# Altium footprint library shkb_lib.PcbLib: 50 footprints (part 1 of 4)
Each footprint in its own frame and in the unit in brackets; x right, y up, seen from the top. Pads: shape width x height; smd on the part's side, far side on the other; paste and mask are expansions set on the pad; w line width, h text height; cw(c..) or ccw(c..) is an arc to the next point about the centre after c.
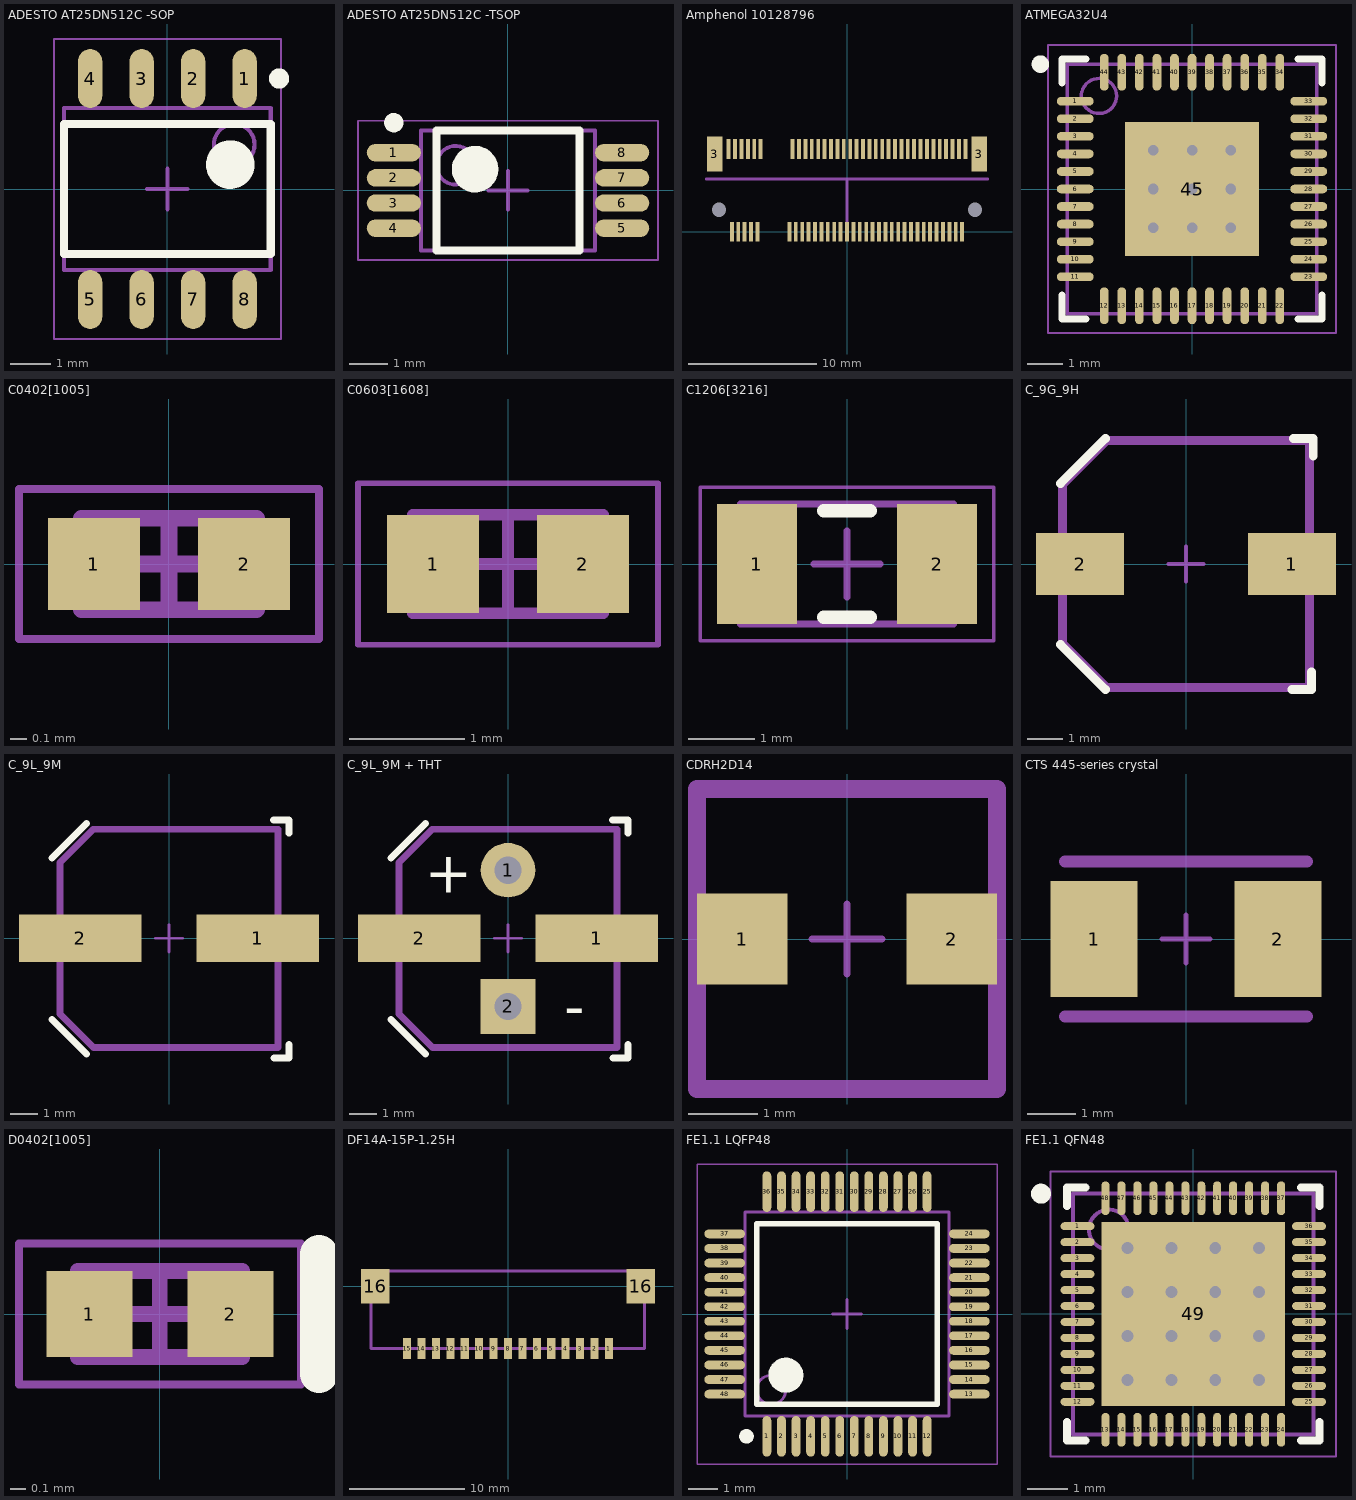
[diagram p0: the footprints below, top view; thin cyan lines are the x and y axes]

## ADESTO AT25DN512C -SOP [mm] "SOIC, 8-Leads, Body 4,92x3,90mm, Pitch 1,27mm, IPC Medium Density"
height 1.75
pads (8):
  oval 0.6x1.45 smd: 1(1.905,2.725) 2(0.635,2.725) 3(-0.635,2.725) 4(-1.905,2.725) 5(-1.905,-2.725) 6(-0.635,-2.725) 7(0.635,-2.725) 8(1.905,-2.725)
Top Overlay:
  circle w0.25: c2.755,2.725 r0.125
  circle w0.6: c1.55,0.6 r0.3
  lines w0.2: -2.55,-1.6 2.55,-1.6 2.55,1.6 -2.55,1.6 -2.55,-1.6
Mechanical 13:
  circle w0.1: c1.65,1.1 r0.5
  lines w0.1: -2.55,-2 2.55,-2 2.55,2 -2.55,2 -2.55,-2
  text ".Designator" at 2.21,-0.316 h0.5
Mechanical 15:
  lines w0.05: -2.8,-3.7 2.8,-3.7 2.8,3.7 -2.8,3.7 -2.8,-3.7
  lines w0.1: -0.5,0 0.5,0 ; 0,-0.5 0,0.5
3D body "ADESTO AT25DN512C.step": height 1.75, standoff 0, extent -2.55,-2.997 2.55,2.997

## ADESTO AT25DN512C -TSOP [mm] "TSOP, 8-Leads, Body 3,00x4,40mm, Pitch 0,65mm, IPC Medium Density"
height 1.2
pads (8):
  oval 1.4x0.45 smd: 1(-2.95,0.975) 2(-2.95,0.325) 3(-2.95,-0.325) 4(-2.95,-0.975) 5(2.95,-0.975) 6(2.95,-0.325) 7(2.95,0.325) 8(2.95,0.975)
Top Overlay:
  circle w0.25: c-2.95,1.75 r0.125
  circle w0.6: c-0.85,0.55 r0.3
  lines w0.2: -1.85,-1.55 -1.85,1.55 1.85,1.55 1.85,-1.55 -1.85,-1.55
Mechanical 13:
  circle w0.1: c-1.35,0.65 r0.5
  lines w0.1: -2.25,-1.55 -2.25,1.55 2.25,1.55 2.25,-1.55 -2.25,-1.55
  text ".Designator" at -1.778,-0.777 h0.5
Mechanical 15:
  lines w0.05: -3.875,-1.8 -3.875,1.8 3.875,1.8 3.875,-1.8 -3.875,-1.8
  lines w0.1: -0.5,0 0.5,0 ; 0,-0.5 0,0.5
3D body "ADESTO AT25DN512C -TSOP.step": height 1.2, standoff 0, extent -3.2,-1.55 3.2,1.55

## Amphenol 10128796 [mm]
pads (71):
  rect 0.3x1.55 smd: 1(-9.25,6.45) 2(-9,0) 3(-8.75,6.45) 4(-8.5,0) 5(-8.25,6.45) 6(-8,0) 7(-7.75,6.45) 8(-7.5,0) 9(-7.25,6.45) 10(-7,0) 11(-6.75,6.45) 20(-4.5,0) 21(-4.25,6.45) 22(-4,0) 23(-3.75,6.45) 24(-3.5,0) 25(-3.25,6.45) 26(-3,0) 27(-2.75,6.45) 28(-2.5,0) 29(-2.25,6.45) 30(-2,0) 31(-1.75,6.45) 32(-1.5,0) 33(-1.25,6.45) 34(-1,0) 35(-0.75,6.45) 36(-0.5,0) 37(-0.25,6.45) 38(0,0) 39(0.25,6.45) 40(0.5,0) 41(0.75,6.45) 42(1,0) 43(1.25,6.45) 44(1.5,0) 45(1.75,6.45) 46(2,0) 47(2.25,6.45) 48(2.5,0) 49(2.75,6.45) 50(3,0) 51(3.25,6.45) 52(3.5,0) 53(3.75,6.45) 54(4,0) 55(4.25,6.45) 56(4.5,0) 57(4.75,6.45) 58(5,0) 59(5.25,6.45) 60(5.5,0) 61(5.75,6.45) 62(6,0) 63(6.25,6.45) 64(6.5,0) 65(6.75,6.45) 66(7,0) 67(7.25,6.45) 68(7.5,0) 69(7.75,6.45) 70(8,0) 71(8.25,6.45) 72(8.5,0) 73(8.75,6.45) 74(9,0) 75(9.25,6.45)
  rect 1.2x2.75 smd: 3(-10.35,6.07) 3(10.35,6.07)
  round 0 hole 1.1 unplated: ""(-10,1.715) ""(10,1.715)
Mechanical 13:
  lines w0.2: -11,4.115 11,4.115 ; 0,-0.025 0,4.115
  text ".Designator" at -7.214,2.373 h0.5
3D body "10128796.stp": height 0.1, standoff -9, extent -10.928,-0.326 10.922,6.324

## ATMEGA32U4 [mm]
height 1
pads (45):
  oval 1.05x0.25 smd: 1(-3.325,2.5) 2(-3.325,2) 3(-3.325,1.5) 4(-3.325,1) 5(-3.325,0.5) 6(-3.325,0) 7(-3.325,-0.5) 8(-3.325,-1) 9(-3.325,-1.5) 10(-3.325,-2) 11(-3.325,-2.5) 23(3.325,-2.5) 24(3.325,-2) 25(3.325,-1.5) 26(3.325,-1) 27(3.325,-0.5) 28(3.325,0) 29(3.325,0.5) 30(3.325,1) 31(3.325,1.5) 32(3.325,2) 33(3.325,2.5)
  oval 0.25x1.05 smd: 12(-2.5,-3.325) 13(-2,-3.325) 14(-1.5,-3.325) 15(-1,-3.325) 16(-0.5,-3.325) 17(0,-3.325) 18(0.5,-3.325) 19(1,-3.325) 20(1.5,-3.325) 21(2,-3.325) 22(2.5,-3.325) 34(2.5,3.325) 35(2,3.325) 36(1.5,3.325) 37(1,3.325) 38(0.5,3.325) 39(0,3.325) 40(-0.5,3.325) 41(-1,3.325) 42(-1.5,3.325) 43(-2,3.325) 44(-2.5,3.325)
  rect 3.81x3.81 smd paste-1000: 45(0,0)
via 1.1,-1.1 diameter 0.508 hole 0.3
via 0,-1.1 diameter 0.508 hole 0.3
via -1.1,-1.1 diameter 0.508 hole 0.3
via 1.1,0 diameter 0.508 hole 0.3
via 0,0 diameter 0.508 hole 0.3
via -1.1,0 diameter 0.508 hole 0.3
via 1.1,1.1 diameter 0.508 hole 0.3
via 0,1.1 diameter 0.508 hole 0.3
via -1.1,1.1 diameter 0.508 hole 0.3
Top Overlay:
  circle w0.25: c-4.318,3.556 r0.125
  lines w0.2: -3.7,-3.025 -3.7,-3.7 -3.025,-3.7 ; -3.7,3.025 -3.7,3.7 -3.025,3.7 ; 3.025,-3.7 3.7,-3.7 3.7,-3.025 ; 3.025,3.7 3.7,3.7 3.7,3.025
Top Paste:
  rectangle: -1.778,-1.778 -0.254,-0.254
  region: 1.778,-1.778 1.778,-0.254 0.254,-0.254 0.254,-1.778
  region: 1.778,1.778 0.254,1.778 0.254,0.254 1.778,0.254
  region: -1.778,1.778 -1.778,0.254 -0.254,0.254 -0.254,1.778
Mechanical 13:
  circle w0.1: c-2.65,2.65 r0.5
  lines w0.1: -3.55,-3.55 3.55,-3.55 3.55,3.55 -3.55,3.55 -3.55,-3.55
  text ".Designator" at -2.345,-0.152 h0.5
Mechanical 15:
  lines w0.05: -4.1,-4.1 4.1,-4.1 4.1,4.1 -4.1,4.1 -4.1,-4.1
  lines w0.1: -0.5,0 0.5,0 ; 0,-0.5 0,0.5
3D body "ATMEGA32U4-combo.step": height 1, standoff 0, extent -3.6,-3.6 3.6,3.6

## C0402[1005] [mm] "Chip Resistor, 2-Leads, Body 1,00x0,50mm, IPC Medium Density"
height 0.5
pads (2):
  rect 0.55x0.55 smd: 1(-0.45,0) 2(0.45,0)
Mechanical 13:
  lines w0.1: -0.525,-0.275 -0.525,0.275 0.525,0.275 0.525,-0.275 -0.525,-0.275
  text ".Designator" at -0.425,-0.1 h0.2
Mechanical 15:
  lines w0.05: -0.9,-0.45 -0.9,0.45 0.9,0.45 0.9,-0.45 -0.9,-0.45
  lines w0.1: -0.275,0 0.275,0 ; 0,-0.275 0,0.275
3D body: height 0.5, standoff 0, extent -0.325,-0.275 0.325,0.275

## C0603[1608] [mm] "Chip Resistor, 2-Leads, Body 1,57x0,80mm, IPC Medium Density"
height 0.5
pads (2):
  rect 0.8x0.85 smd: 1(-0.65,0) 2(0.65,0)
Mechanical 13:
  lines w0.1: -0.825,-0.425 -0.825,0.425 0.825,0.425 0.825,-0.425 -0.825,-0.425
  text ".Designator" at -1.05,-0.275 h0.35
Mechanical 15:
  lines w0.05: -1.3,-0.7 -1.3,0.7 1.3,0.7 1.3,-0.7 -1.3,-0.7
  lines w0.1: -0.425,0 0.425,0 ; 0,-0.425 0,0.425
3D body: height 0.5, standoff 0, extent -0.825,-0.425 -0.525,0.425
3D body: height 0.5, standoff 0, extent 0.525,-0.425 0.825,0.425
3D body: height 0.5, standoff 0, extent -0.525,-0.425 0.525,0.425

## C1206[3216] [mm]
height 1.2
pads (2):
  rect 1.2x1.8 smd: 1(-1.35,0) 2(1.35,0)
Top Overlay:
  lines w0.2: -0.35,-0.8 0.35,-0.8 ; -0.35,0.8 0.35,0.8
Mechanical 13:
  lines w0.1: -1.6,-0.9 1.6,-0.9 1.6,0.9 -1.6,0.9 -1.6,-0.9
  text ".Designator" at -1.245,-0.152 h0.5
Mechanical 15:
  lines w0.05: -2.2,-1.15 2.2,-1.15 2.2,1.15 -2.2,1.15 -2.2,-1.15
  lines w0.1: -0.5,0 0.5,0 ; 0,-0.5 0,0.5
3D body: height 1.2, standoff 0, extent 1.1,-0.9 1.6,0.9
3D body: height 1.2, standoff 0, extent -1.6,-0.9 -1.1,0.9
3D body: height 1.2, standoff 0, extent -1.1,-0.9 1.1,0.9

## C_9G_9H [mm] "Size 9G and 9H Aluminium capacitor (KEMET)"
pads (2):
  rect 2.5x1.75 smd: 1(3,0) 2(-3,0)
Top Overlay:
  lines w0.254: -3.556,-2.286 -2.286,-3.556 ; -3.556,2.286 -2.286,3.556 ; 3.006,-3.556 3.556,-3.556 ; 3.048,3.556 3.605,3.556 3.605,3.066 ; 3.556,-3.531 3.556,-3.056
Mechanical 13:
  lines w0.254: -3.5,-2.25 -2.25,-3.5 -1.5,-3.5 3.5,-3.5 3.5,3.5 -1.5,3.5 -2.25,3.5 -3.5,2.25 -3.5,-2.25
  text ".Designator" at -2.4,-2.225 h0.5
Mechanical 15:
  lines w0.1: -0.5,0 0.5,0 ; 0,-0.5 0,0.5
3D body "STL@%STL@%STL@%CHEMI-F55.stp": height 5.26, standoff 0, extent -3.594,-3.302 3.594,3.302

## C_9L_9M [mm] "Size 9L and 9M Aluminium capacitor"
height 6.7
pads (2):
  rect 4.5x1.75 smd: 1(3.25,0) 2(-3.25,0)
Top Overlay:
  lines w0.254: -4.293,-2.972 -3.023,-4.242 ; -4.293,2.946 -3.023,4.216 ; 3.835,4.343 4.392,4.343 4.392,3.853 ; 3.844,-4.394 4.394,-4.394 ; 4.394,-4.369 4.394,-3.894
Mechanical 13:
  lines w0.254: -4,-2.774 -4,2.774 -2.774,4 -1.5,4 3.5,4 4,4 4,-4 3.5,-4 -1.5,-4 -2.774,-4 -4,-2.774
  text ".Designator" at -2.4,-2.225 h0.5
Mechanical 15:
  lines w0.1: -0.5,0 0.5,0 ; 0,-0.5 0,0.5
3D body "EEV476M050A9LAA.step": height 6.5, standoff 0, extent -4.8,-4.258 4.8,4.242

## C_9L_9M + THT [mm] "Size 9L and 9M Aluminium capacitor"
height 6.7
pads (4):
  round 2 hole 1 mask+0.102: 1(0,2.5)
  rect 4.5x1.75 smd: 1(3.25,0) 2(-3.25,0)
  rect 2x2 hole 1 mask+0.102: 2(0,-2.5)
Top Overlay:
  lines w0.254: -4.293,-2.972 -3.023,-4.242 ; -4.293,2.946 -3.023,4.216 ; 3.835,4.343 4.392,4.343 4.392,3.853 ; 3.844,-4.394 4.394,-4.394 ; 4.394,-4.369 4.394,-3.894
  text "-" at 2.057,-3.251 h1.52
  text "+" at -3.048,1.676 h1.52
Mechanical 13:
  lines w0.254: -4,-2.774 -4,2.774 -2.774,4 -1.5,4 3.5,4 4,4 4,-4 3.5,-4 -1.5,-4 -2.774,-4 -4,-2.774
  text ".Designator" at -2.4,-2.225 h0.5
Mechanical 15:
  lines w0.1: -0.5,0 0.5,0 ; 0,-0.5 0,0.5
3D body "EEV476M050A9LAA.step": height 6.5, standoff 0, extent -4.8,-4.258 4.8,4.242

## CDRH2D14 [mm]
pads (2):
  rect 1.3x1.3 smd: 1(-1.5,0) 2(1.5,0)
Mechanical 13:
  lines w0.254: -2.15,-2.15 -2.15,2.15 2.15,2.15 2.15,-2.15 -2.15,-2.15
  text ".Designator" at -1.803,0.838 h0.5
Mechanical 15:
  lines w0.1: -0.5,0 0.5,0 ; 0,-0.5 0,0.5
3D body "CDRH2D14.STEP": height 0.76, standoff -0.64, extent -1.761,-1.803 1.812,1.82

## CTS 445-series crystal [mm]
pads (2):
  rect 1.8x2.4 smd: 1(-1.9,0) 2(1.9,0)
Mechanical 13:
  lines w0.254: -2.5,-1.6 2.5,-1.6 ; -2.5,1.6 2.5,1.6
  text ".Designator" at -1.372,-0.152 h0.5
Mechanical 15:
  lines w0.1: -0.5,0 0.5,0 ; 0,-0.5 0,0.5
3D body "ABM3.STEP": height 1.3, standoff 0, extent -2.5,-1.6 2.5,1.6

## D0402[1005] [mm] "Chip Resistor, 2-Leads, Body 1,00x0,50mm, IPC Medium Density"
height 0.5
pads (2):
  rect 0.55x0.55 smd: 1(-0.45,0) 2(0.45,0)
Top Overlay:
  lines w0.245: 1.016,-0.381 1.016,0.381
Mechanical 13:
  lines w0.1: -0.525,-0.275 0.525,-0.275 0.525,0.275 -0.525,0.275 -0.525,-0.275
  text ".Designator" at -0.425,-0.1 h0.2
Mechanical 15:
  lines w0.05: -0.9,-0.45 0.9,-0.45 0.9,0.45 -0.9,0.45 -0.9,-0.45
  lines w0.1: -0.275,0 0.275,0 ; 0,-0.275 0,0.275
3D body: height 0.5, standoff 0, extent -0.325,-0.275 0.325,0.275

## DF14A-15P-1.25H [mm]
pads (17):
  rect 0.7x1.8 smd: 1(8.75,-5.4) 2(7.5,-5.4) 3(6.25,-5.4) 4(5,-5.4) 5(3.75,-5.4) 6(2.5,-5.4) 7(1.25,-5.4) 8(0,-5.4) 9(-1.25,-5.4) 10(-2.5,-5.4) 11(-3.75,-5.4) 12(-5,-5.4) 13(-6.25,-5.4) 14(-7.5,-5.4) 15(-8.75,-5.4)
  rect 2.5x3 smd: 16(-11.5,0) 16(11.5,0)
Mechanical 13:
  lines w0.254: -11.875,-5.385 11.825,-5.385 11.825,1.315 -11.875,1.315 -11.875,-5.385
  text ".Designator" at -3.226,-1.702 h0.5

## FE1.1 LQFP48 [mm] "TSQFP, 48-Leads, Body 7.00x7.00mm, Pitch 0.50mm, IPC Medium Density"
height 1.5
pads (48):
  oval 0.3x1.4 smd: 1(-2.75,-4.2) 2(-2.25,-4.2) 3(-1.75,-4.2) 4(-1.25,-4.2) 5(-0.75,-4.2) 6(-0.25,-4.2) 7(0.25,-4.2) 8(0.75,-4.2) 9(1.25,-4.2) 10(1.75,-4.2) 11(2.25,-4.2) 12(2.75,-4.2) 25(2.75,4.2) 26(2.25,4.2) 27(1.75,4.2) 28(1.25,4.2) 29(0.75,4.2) 30(0.25,4.2) 31(-0.25,4.2) 32(-0.75,4.2) 33(-1.25,4.2) 34(-1.75,4.2) 35(-2.25,4.2) 36(-2.75,4.2)
  oval 1.4x0.3 smd: 13(4.2,-2.75) 14(4.2,-2.25) 15(4.2,-1.75) 16(4.2,-1.25) 17(4.2,-0.75) 18(4.2,-0.25) 19(4.2,0.25) 20(4.2,0.75) 21(4.2,1.25) 22(4.2,1.75) 23(4.2,2.25) 24(4.2,2.75) 37(-4.2,2.75) 38(-4.2,2.25) 39(-4.2,1.75) 40(-4.2,1.25) 41(-4.2,0.75) 42(-4.2,0.25) 43(-4.2,-0.25) 44(-4.2,-0.75) 45(-4.2,-1.25) 46(-4.2,-1.75) 47(-4.2,-2.25) 48(-4.2,-2.75)
Top Overlay:
  circle w0.25: c-3.45,-4.2 r0.125
  circle w0.6: c-2.1,-2.1 r0.3
  lines w0.2: -3.1,-3.1 3.1,-3.1 3.1,3.1 -3.1,3.1 -3.1,-3.1
Mechanical 13:
  circle w0.1: c-2.6,-2.6 r0.5
  lines w0.1: -3.5,-3.5 3.5,-3.5 3.5,3.5 -3.5,3.5 -3.5,-3.5
  text ".Designator" at 0.076,-2.235 h0.5
Mechanical 15:
  lines w0.05: -5.15,-5.15 5.15,-5.15 5.15,5.15 -5.15,5.15 -5.15,-5.15
  lines w0.1: -0.5,0 0.5,0 ; 0,-0.5 0,0.5
3D body "FE1.1 LQFP48.step": height 1.5, standoff 0, extent -4.5,-4.5 4.5,4.5

## FE1.1 QFN48 [mm]
height 0.8
pads (49):
  oval 0.85x0.2 smd: 1(-2.9,2.2) 2(-2.9,1.8) 3(-2.9,1.4) 4(-2.9,1) 5(-2.9,0.6) 6(-2.9,0.2) 7(-2.9,-0.2) 8(-2.9,-0.6) 9(-2.9,-1) 10(-2.9,-1.4) 11(-2.9,-1.8) 12(-2.9,-2.2) 25(2.9,-2.2) 26(2.9,-1.8) 27(2.9,-1.4) 28(2.9,-1) 29(2.9,-0.6) 30(2.9,-0.2) 31(2.9,0.2) 32(2.9,0.6) 33(2.9,1) 34(2.9,1.4) 35(2.9,1.8) 36(2.9,2.2)
  oval 0.2x0.85 smd: 13(-2.2,-2.9) 14(-1.8,-2.9) 15(-1.4,-2.9) 16(-1,-2.9) 17(-0.6,-2.9) 18(-0.2,-2.9) 19(0.2,-2.9) 20(0.6,-2.9) 21(1,-2.9) 22(1.4,-2.9) 23(1.8,-2.9) 24(2.2,-2.9) 37(2.2,2.9) 38(1.8,2.9) 39(1.4,2.9) 40(1,2.9) 41(0.6,2.9) 42(0.2,2.9) 43(-0.2,2.9) 44(-0.6,2.9) 45(-1,2.9) 46(-1.4,2.9) 47(-1.8,2.9) 48(-2.2,2.9)
  rect 4.6x4.6 smd: 49(0,0)
via -1.65,1.65 diameter 0.6 hole 0.3
via -0.55,1.65 diameter 0.6 hole 0.3
via 0.55,1.65 diameter 0.6 hole 0.3
via 1.65,1.65 diameter 0.6 hole 0.3
via -1.65,0.55 diameter 0.6 hole 0.3
via -0.55,0.55 diameter 0.6 hole 0.3
via 0.55,0.55 diameter 0.6 hole 0.3
via 1.65,0.55 diameter 0.6 hole 0.3
via -1.65,-0.55 diameter 0.6 hole 0.3
via -0.55,-0.55 diameter 0.6 hole 0.3
via 0.55,-0.55 diameter 0.6 hole 0.3
via 1.65,-0.55 diameter 0.6 hole 0.3
via -1.65,-1.65 diameter 0.6 hole 0.3
via -0.55,-1.65 diameter 0.6 hole 0.3
via 0.55,-1.65 diameter 0.6 hole 0.3
via 1.65,-1.65 diameter 0.6 hole 0.3
Top Overlay:
  circle w0.25: c-3.815,3.015 r0.125
  lines w0.2: -3.165,-2.7 -3.165,-3.165 -2.7,-3.165 ; -3.165,2.7 -3.165,3.165 -2.7,3.165 ; 2.7,-3.165 3.165,-3.165 3.165,-2.7 ; 2.7,3.165 3.165,3.165 3.165,2.7
Mechanical 13:
  circle w0.1: c-2.115,2.115 r0.5
  lines w0.1: -3.015,-3.015 -3.015,3.015 3.015,3.015 3.015,-3.015 -3.015,-3.015
  text ".Designator" at -1.688,-0.203 h0.5
Mechanical 15:
  lines w0.05: -3.575,-3.575 -3.575,3.575 3.575,3.575 3.575,-3.575 -3.575,-3.575
  lines w0.1: -0.5,0 0.5,0 ; 0,-0.5 0,0.5
3D body "FE1.1 QFN48.step": height 0.8, standoff 0, extent -3.016,-3.016 3.016,3.016